# Altium schematic symbol library jlcpcb_2025_04_capacitors_extended_0805.schlib: 3281 symbols (part 3 of 18)
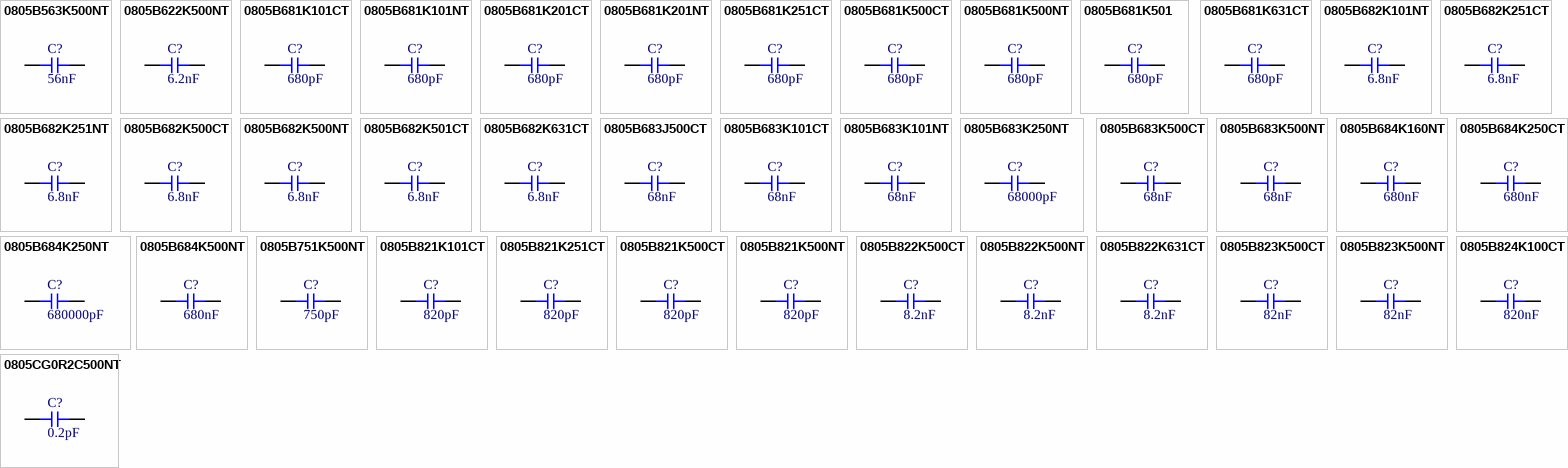
[diagram p84: symbols 0805B563K500NT to 0805CG0R2C500NT]

## 0805CG0R2C500NT
designator C?  Capacitance: 0.2pF  (hidden comment: *)
Capacitor, Ceramic (MLCC), 0.2pF, 50V, SMD 0805; Manufacturer: FH(Guangdong Fenghua Advanced Tech); Manufacturer Part Number: 0805CG0R2C500NT; Package Size: 0805; JLCPCB Basic Part: No; JLCPCB Part Number: C1322376; Supplier 1: LCSC; Category: Capacitors - MLCC; Supplier Part Number 1: C1322376; Voltage Rating: 50V; RoHS: Yes; ComponentLink1Description: Datasheet; ComponentLink1URL: https://wmsc.lcsc.com/wmsc/upload/file/pdf/v2/lcsc/2304140030_FH--Guangdong-Fenghua-Advanced-Tech-0805CG0R2C500NT_C1322376.pdf; ComponentLink2Description: JLCPCB Part URL; ComponentLink2URL: https://jlcpcb.com/partdetail/C1322376; ComponentLink3Description: LCSC Part URL; ComponentLink3URL: https://lcsc.com/product-detail/Multilayer-Ceramic-Capacitors-MLCC---SMD-SMT_FH-Guangdong-Fenghua-Advanced-Tech-FH-Guangdong-Fenghua-Advanced-Tech-0805CG0R2C500NT_C1322376.html
footprint CAP-0805 (0805 (2012M) Capacitor)
pins: 1, 2

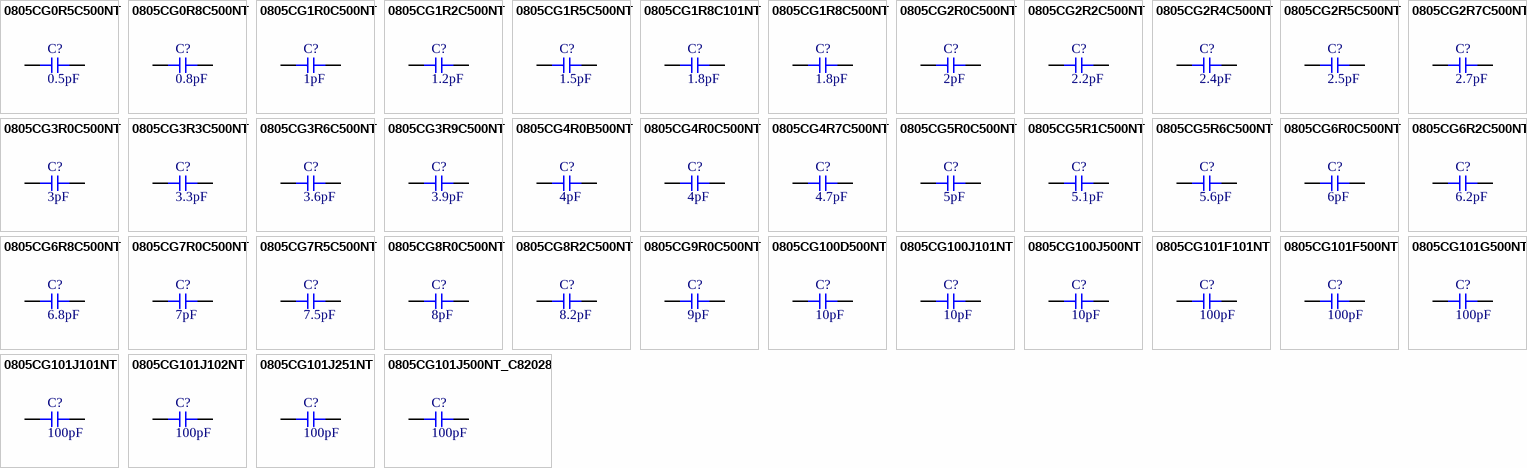
[diagram p9: symbols 0805CG0R5C500NT to 0805CG101J500NT_C82028]

## 0805CG0R5C500NT
designator C?  Capacitance: 0.5pF  (hidden comment: *)
Capacitor, Ceramic (MLCC), 0.5pF, 50V, C0G, SMD 0805; Manufacturer: FH(Guangdong Fenghua Advanced Tech); Manufacturer Part Number: 0805CG0R5C500NT; Package Size: 0805; JLCPCB Basic Part: No; JLCPCB Part Number: C1784; Supplier 1: LCSC; Category: Capacitors - MLCC; Supplier Part Number 1: C1784; Voltage Rating: 50V; Temperature Coefficient: C0G; RoHS: Yes; ComponentLink1Description: Datasheet; ComponentLink1URL: https://wmsc.lcsc.com/wmsc/upload/file/pdf/v2/lcsc/2304140030_FH--Guangdong-Fenghua-Advanced-Tech-0805CG0R5C500NT_C1784.pdf; ComponentLink2Description: JLCPCB Part URL; ComponentLink2URL: https://jlcpcb.com/partdetail/C1784; ComponentLink3Description: LCSC Part URL; ComponentLink3URL: https://lcsc.com/product-detail/Multilayer-Ceramic-Capacitors-MLCC---SMD-SMT_FH-Guangdong-Fenghua-Advanced-Tech-FH-Guangdong-Fenghua-Advanced-Tech-0805CG0R5C500NT_C1784.html
footprint CAP-0805 (0805 (2012M) Capacitor)
pins: 1, 2

## 0805CG0R8C500NT
designator C?  Capacitance: 0.8pF  (hidden comment: *)
Capacitor, Ceramic (MLCC), 0.8pF, 50V, SMD 0805; Manufacturer: FH(Guangdong Fenghua Advanced Tech); Manufacturer Part Number: 0805CG0R8C500NT; Package Size: 0805; JLCPCB Basic Part: No; JLCPCB Part Number: C967583; Supplier 1: LCSC; Category: Capacitors - MLCC; Supplier Part Number 1: C967583; Voltage Rating: 50V; RoHS: Yes; ComponentLink1Description: Datasheet; ComponentLink1URL: https://wmsc.lcsc.com/wmsc/upload/file/pdf/v2/lcsc/2304140030_FH--Guangdong-Fenghua-Advanced-Tech-0805CG0R8C500NT_C967583.pdf; ComponentLink2Description: JLCPCB Part URL; ComponentLink2URL: https://jlcpcb.com/partdetail/C967583; ComponentLink3Description: LCSC Part URL; ComponentLink3URL: https://lcsc.com/product-detail/Multilayer-Ceramic-Capacitors-MLCC---SMD-SMT_FH-Guangdong-Fenghua-Advanced-Tech-FH-Guangdong-Fenghua-Advanced-Tech-0805CG0R8C500NT_C967583.html
footprint CAP-0805 (0805 (2012M) Capacitor)
pins: 1, 2

## 0805CG1R0C500NT
designator C?  Capacitance: 1pF  (hidden comment: *)
Capacitor, Ceramic (MLCC), 1pF, 50V, C0G, SMD 0805; Manufacturer: FH(Guangdong Fenghua Advanced Tech); Manufacturer Part Number: 0805CG1R0C500NT; Package Size: 0805; JLCPCB Basic Part: No; JLCPCB Part Number: C1786; Supplier 1: LCSC; Category: Capacitors - MLCC; Supplier Part Number 1: C1786; Voltage Rating: 50V; Temperature Coefficient: C0G; RoHS: Yes; ComponentLink1Description: Datasheet; ComponentLink1URL: https://wmsc.lcsc.com/wmsc/upload/file/pdf/v2/lcsc/2304140030_FH--Guangdong-Fenghua-Advanced-Tech-0805CG1R0C500NT_C1786.pdf; ComponentLink2Description: JLCPCB Part URL; ComponentLink2URL: https://jlcpcb.com/partdetail/C1786; ComponentLink3Description: LCSC Part URL; ComponentLink3URL: https://lcsc.com/product-detail/Multilayer-Ceramic-Capacitors-MLCC---SMD-SMT_FH-Guangdong-Fenghua-Advanced-Tech-FH-Guangdong-Fenghua-Advanced-Tech-0805CG1R0C500NT_C1786.html
footprint CAP-0805 (0805 (2012M) Capacitor)
pins: 1, 2

## 0805CG1R2C500NT
designator C?  Capacitance: 1.2pF  (hidden comment: *)
Capacitor, Ceramic (MLCC), 1.2pF, 50V, C0G, SMD 0805; Manufacturer: FH(Guangdong Fenghua Advanced Tech); Manufacturer Part Number: 0805CG1R2C500NT; Package Size: 0805; JLCPCB Basic Part: No; JLCPCB Part Number: C1787; Supplier 1: LCSC; Category: Capacitors - MLCC; Supplier Part Number 1: C1787; Voltage Rating: 50V; Temperature Coefficient: C0G; RoHS: Yes; ComponentLink1Description: Datasheet; ComponentLink1URL: https://wmsc.lcsc.com/wmsc/upload/file/pdf/v2/lcsc/2304140030_FH--Guangdong-Fenghua-Advanced-Tech-0805CG1R2C500NT_C1787.pdf; ComponentLink2Description: JLCPCB Part URL; ComponentLink2URL: https://jlcpcb.com/partdetail/C1787; ComponentLink3Description: LCSC Part URL; ComponentLink3URL: https://lcsc.com/product-detail/Multilayer-Ceramic-Capacitors-MLCC---SMD-SMT_FH-Guangdong-Fenghua-Advanced-Tech-FH-Guangdong-Fenghua-Advanced-Tech-0805CG1R2C500NT_C1787.html
footprint CAP-0805 (0805 (2012M) Capacitor)
pins: 1, 2

## 0805CG1R5C500NT
designator C?  Capacitance: 1.5pF  (hidden comment: *)
Capacitor, Ceramic (MLCC), 1.5pF, 50V, C0G, SMD 0805; Manufacturer: FH(Guangdong Fenghua Advanced Tech); Manufacturer Part Number: 0805CG1R5C500NT; Package Size: 0805; JLCPCB Basic Part: No; JLCPCB Part Number: C1788; Supplier 1: LCSC; Category: Capacitors - MLCC; Supplier Part Number 1: C1788; Voltage Rating: 50V; Temperature Coefficient: C0G; RoHS: Yes; ComponentLink1Description: Datasheet; ComponentLink1URL: https://wmsc.lcsc.com/wmsc/upload/file/pdf/v2/lcsc/2304140030_FH--Guangdong-Fenghua-Advanced-Tech-0805CG1R5C500NT_C1788.pdf; ComponentLink2Description: JLCPCB Part URL; ComponentLink2URL: https://jlcpcb.com/partdetail/C1788; ComponentLink3Description: LCSC Part URL; ComponentLink3URL: https://lcsc.com/product-detail/Multilayer-Ceramic-Capacitors-MLCC---SMD-SMT_FH-Guangdong-Fenghua-Advanced-Tech-FH-Guangdong-Fenghua-Advanced-Tech-0805CG1R5C500NT_C1788.html
footprint CAP-0805 (0805 (2012M) Capacitor)
pins: 1, 2

## 0805CG1R8C101NT
designator C?  Capacitance: 1.8pF  (hidden comment: *)
Capacitor, Ceramic (MLCC), 1.8pF, 100V, C0G, SMD 0805; Manufacturer: FH (Guangdong Fenghua Advanced Tech); Manufacturer Part Number: 0805CG1R8C101NT; Package Size: 0805; JLCPCB Basic Part: No; JLCPCB Part Number: C2961290; Supplier 1: LCSC; Category: Capacitors - MLCC; Supplier Part Number 1: C2961290; Voltage Rating: 100V; Temperature Coefficient: C0G; RoHS: Yes; ComponentLink1Description: Datasheet; ComponentLink1URL: https://wmsc.lcsc.com/wmsc/upload/file/pdf/v2/lcsc/2201211500_FH--Guangdong-Fenghua-Advanced-Tech-0805CG1R8C101NT_C2961290.pdf; ComponentLink2Description: JLCPCB Part URL; ComponentLink2URL: https://jlcpcb.com/partdetail/C2961290; ComponentLink3Description: LCSC Part URL; ComponentLink3URL: https://lcsc.com/product-detail/Multilayer-Ceramic-Capacitors-MLCC---SMD-SMT_FH-Guangdong-Fenghua-Advanced-Tech-FH-Guangdong-Fenghua-Advanced-Tech-0805CG1R8C101NT_C2961290.html
footprint CAP-0805 (0805 (2012M) Capacitor)
pins: 1, 2

## 0805CG1R8C500NT
designator C?  Capacitance: 1.8pF  (hidden comment: *)
Capacitor, Ceramic (MLCC), 1.8pF, 50V, C0G, SMD 0805; Manufacturer: FH(Guangdong Fenghua Advanced Tech); Manufacturer Part Number: 0805CG1R8C500NT; Package Size: 0805; JLCPCB Basic Part: No; JLCPCB Part Number: C1789; Supplier 1: LCSC; Category: Capacitors - MLCC; Supplier Part Number 1: C1789; Voltage Rating: 50V; Temperature Coefficient: C0G; RoHS: Yes; ComponentLink1Description: Datasheet; ComponentLink1URL: https://wmsc.lcsc.com/wmsc/upload/file/pdf/v2/lcsc/2304140030_FH--Guangdong-Fenghua-Advanced-Tech-0805CG1R8C500NT_C1789.pdf; ComponentLink2Description: JLCPCB Part URL; ComponentLink2URL: https://jlcpcb.com/partdetail/C1789; ComponentLink3Description: LCSC Part URL; ComponentLink3URL: https://lcsc.com/product-detail/Multilayer-Ceramic-Capacitors-MLCC---SMD-SMT_FH-Guangdong-Fenghua-Advanced-Tech-FH-Guangdong-Fenghua-Advanced-Tech-0805CG1R8C500NT_C1789.html
footprint CAP-0805 (0805 (2012M) Capacitor)
pins: 1, 2

## 0805CG2R0C500NT
designator C?  Capacitance: 2pF  (hidden comment: *)
Capacitor, Ceramic (MLCC), 2pF, 50V, C0G, SMD 0805; Manufacturer: FH(Guangdong Fenghua Advanced Tech); Manufacturer Part Number: 0805CG2R0C500NT; Package Size: 0805; JLCPCB Basic Part: No; JLCPCB Part Number: C1800; Supplier 1: LCSC; Category: Capacitors - MLCC; Supplier Part Number 1: C1800; Voltage Rating: 50V; Temperature Coefficient: C0G; RoHS: Yes; ComponentLink1Description: Datasheet; ComponentLink1URL: https://wmsc.lcsc.com/wmsc/upload/file/pdf/v2/lcsc/2304140030_FH--Guangdong-Fenghua-Advanced-Tech-0805CG2R0C500NT_C1800.pdf; ComponentLink2Description: JLCPCB Part URL; ComponentLink2URL: https://jlcpcb.com/partdetail/C1800; ComponentLink3Description: LCSC Part URL; ComponentLink3URL: https://lcsc.com/product-detail/Multilayer-Ceramic-Capacitors-MLCC---SMD-SMT_FH-Guangdong-Fenghua-Advanced-Tech-FH-Guangdong-Fenghua-Advanced-Tech-0805CG2R0C500NT_C1800.html
footprint CAP-0805 (0805 (2012M) Capacitor)
pins: 1, 2

## 0805CG2R2C500NT
designator C?  Capacitance: 2.2pF  (hidden comment: *)
Capacitor, Ceramic (MLCC), 2.2pF, 50V, C0G, SMD 0805; Manufacturer: FH(Guangdong Fenghua Advanced Tech); Manufacturer Part Number: 0805CG2R2C500NT; Package Size: 0805; JLCPCB Basic Part: No; JLCPCB Part Number: C1801; Supplier 1: LCSC; Category: Capacitors - MLCC; Supplier Part Number 1: C1801; Voltage Rating: 50V; Temperature Coefficient: C0G; RoHS: Yes; ComponentLink1Description: Datasheet; ComponentLink1URL: https://wmsc.lcsc.com/wmsc/upload/file/pdf/v2/lcsc/2304140030_FH--Guangdong-Fenghua-Advanced-Tech-0805CG2R2C500NT_C1801.pdf; ComponentLink2Description: JLCPCB Part URL; ComponentLink2URL: https://jlcpcb.com/partdetail/C1801; ComponentLink3Description: LCSC Part URL; ComponentLink3URL: https://lcsc.com/product-detail/Multilayer-Ceramic-Capacitors-MLCC---SMD-SMT_FH-Guangdong-Fenghua-Advanced-Tech-FH-Guangdong-Fenghua-Advanced-Tech-0805CG2R2C500NT_C1801.html
footprint CAP-0805 (0805 (2012M) Capacitor)
pins: 1, 2

## 0805CG2R4C500NT
designator C?  Capacitance: 2.4pF  (hidden comment: *)
Capacitor, Ceramic (MLCC), 2.4pF, 50V, C0G, SMD 0805; Manufacturer: FH(Guangdong Fenghua Advanced Tech); Manufacturer Part Number: 0805CG2R4C500NT; Package Size: 0805; JLCPCB Basic Part: No; JLCPCB Part Number: C502146; Supplier 1: LCSC; Category: Capacitors - MLCC; Supplier Part Number 1: C502146; Voltage Rating: 50V; Temperature Coefficient: C0G; RoHS: Yes; ComponentLink1Description: Datasheet; ComponentLink1URL: https://wmsc.lcsc.com/wmsc/upload/file/pdf/v2/lcsc/2304140030_FH--Guangdong-Fenghua-Advanced-Tech-0805CG2R4C500NT_C502146.pdf; ComponentLink2Description: JLCPCB Part URL; ComponentLink2URL: https://jlcpcb.com/partdetail/C502146; ComponentLink3Description: LCSC Part URL; ComponentLink3URL: https://lcsc.com/product-detail/Multilayer-Ceramic-Capacitors-MLCC---SMD-SMT_FH-Guangdong-Fenghua-Advanced-Tech-FH-Guangdong-Fenghua-Advanced-Tech-0805CG2R4C500NT_C502146.html
footprint CAP-0805 (0805 (2012M) Capacitor)
pins: 1, 2

## 0805CG2R5C500NT
designator C?  Capacitance: 2.5pF  (hidden comment: *)
Capacitor, Ceramic (MLCC), 2.5pF, 50V, C0G, SMD 0805; Manufacturer: FH(Guangdong Fenghua Advanced Tech); Manufacturer Part Number: 0805CG2R5C500NT; Package Size: 0805; JLCPCB Basic Part: No; JLCPCB Part Number: C1802; Supplier 1: LCSC; Category: Capacitors - MLCC; Supplier Part Number 1: C1802; Voltage Rating: 50V; Temperature Coefficient: C0G; RoHS: Yes; ComponentLink1Description: Datasheet; ComponentLink1URL: https://wmsc.lcsc.com/wmsc/upload/file/pdf/v2/lcsc/2304140030_FH--Guangdong-Fenghua-Advanced-Tech-0805CG2R5C500NT_C1802.pdf; ComponentLink2Description: JLCPCB Part URL; ComponentLink2URL: https://jlcpcb.com/partdetail/C1802; ComponentLink3Description: LCSC Part URL; ComponentLink3URL: https://lcsc.com/product-detail/Multilayer-Ceramic-Capacitors-MLCC---SMD-SMT_FH-Guangdong-Fenghua-Advanced-Tech-FH-Guangdong-Fenghua-Advanced-Tech-0805CG2R5C500NT_C1802.html
footprint CAP-0805 (0805 (2012M) Capacitor)
pins: 1, 2

## 0805CG2R7C500NT
designator C?  Capacitance: 2.7pF  (hidden comment: *)
Capacitor, Ceramic (MLCC), 2.7pF, 50V, C0G, SMD 0805; Manufacturer: FH(Guangdong Fenghua Advanced Tech); Manufacturer Part Number: 0805CG2R7C500NT; Package Size: 0805; JLCPCB Basic Part: No; JLCPCB Part Number: C1803; Supplier 1: LCSC; Category: Capacitors - MLCC; Supplier Part Number 1: C1803; Voltage Rating: 50V; Temperature Coefficient: C0G; RoHS: Yes; ComponentLink1Description: Datasheet; ComponentLink1URL: https://wmsc.lcsc.com/wmsc/upload/file/pdf/v2/lcsc/2304140030_FH--Guangdong-Fenghua-Advanced-Tech-0805CG2R7C500NT_C1803.pdf; ComponentLink2Description: JLCPCB Part URL; ComponentLink2URL: https://jlcpcb.com/partdetail/C1803; ComponentLink3Description: LCSC Part URL; ComponentLink3URL: https://lcsc.com/product-detail/Multilayer-Ceramic-Capacitors-MLCC---SMD-SMT_FH-Guangdong-Fenghua-Advanced-Tech-FH-Guangdong-Fenghua-Advanced-Tech-0805CG2R7C500NT_C1803.html
footprint CAP-0805 (0805 (2012M) Capacitor)
pins: 1, 2

## 0805CG3R0C500NT
designator C?  Capacitance: 3pF  (hidden comment: *)
Capacitor, Ceramic (MLCC), 3pF, 50V, C0G, SMD 0805; Manufacturer: FH(Guangdong Fenghua Advanced Tech); Manufacturer Part Number: 0805CG3R0C500NT; Package Size: 0805; JLCPCB Basic Part: No; JLCPCB Part Number: C1810; Supplier 1: LCSC; Category: Capacitors - MLCC; Supplier Part Number 1: C1810; Voltage Rating: 50V; Temperature Coefficient: C0G; RoHS: Yes; ComponentLink1Description: Datasheet; ComponentLink1URL: https://wmsc.lcsc.com/wmsc/upload/file/pdf/v2/lcsc/2304140030_FH--Guangdong-Fenghua-Advanced-Tech-0805CG3R0C500NT_C1810.pdf; ComponentLink2Description: JLCPCB Part URL; ComponentLink2URL: https://jlcpcb.com/partdetail/C1810; ComponentLink3Description: LCSC Part URL; ComponentLink3URL: https://lcsc.com/product-detail/Multilayer-Ceramic-Capacitors-MLCC---SMD-SMT_FH-Guangdong-Fenghua-Advanced-Tech-FH-Guangdong-Fenghua-Advanced-Tech-0805CG3R0C500NT_C1810.html
footprint CAP-0805 (0805 (2012M) Capacitor)
pins: 1, 2

## 0805CG3R3C500NT
designator C?  Capacitance: 3.3pF  (hidden comment: *)
Capacitor, Ceramic (MLCC), 3.3pF, 50V, C0G, SMD 0805; Manufacturer: FH(Guangdong Fenghua Advanced Tech); Manufacturer Part Number: 0805CG3R3C500NT; Package Size: 0805; JLCPCB Basic Part: No; JLCPCB Part Number: C1811; Supplier 1: LCSC; Category: Capacitors - MLCC; Supplier Part Number 1: C1811; Voltage Rating: 50V; Temperature Coefficient: C0G; RoHS: Yes; ComponentLink1Description: Datasheet; ComponentLink1URL: https://wmsc.lcsc.com/wmsc/upload/file/pdf/v2/lcsc/2304140030_FH--Guangdong-Fenghua-Advanced-Tech-0805CG3R3C500NT_C1811.pdf; ComponentLink2Description: JLCPCB Part URL; ComponentLink2URL: https://jlcpcb.com/partdetail/C1811; ComponentLink3Description: LCSC Part URL; ComponentLink3URL: https://lcsc.com/product-detail/Multilayer-Ceramic-Capacitors-MLCC---SMD-SMT_FH-Guangdong-Fenghua-Advanced-Tech-FH-Guangdong-Fenghua-Advanced-Tech-0805CG3R3C500NT_C1811.html
footprint CAP-0805 (0805 (2012M) Capacitor)
pins: 1, 2

## 0805CG3R6C500NT
designator C?  Capacitance: 3.6pF  (hidden comment: *)
Capacitor, Ceramic (MLCC), 3.6pF, 50V, C0G, SMD 0805; Manufacturer: FH(Guangdong Fenghua Advanced Tech); Manufacturer Part Number: 0805CG3R6C500NT; Package Size: 0805; JLCPCB Basic Part: No; JLCPCB Part Number: C1812; Supplier 1: LCSC; Category: Capacitors - MLCC; Supplier Part Number 1: C1812; Voltage Rating: 50V; Temperature Coefficient: C0G; RoHS: Yes; ComponentLink1Description: Datasheet; ComponentLink1URL: https://wmsc.lcsc.com/wmsc/upload/file/pdf/v2/lcsc/2304140030_FH--Guangdong-Fenghua-Advanced-Tech-0805CG3R6C500NT_C1812.pdf; ComponentLink2Description: JLCPCB Part URL; ComponentLink2URL: https://jlcpcb.com/partdetail/C1812; ComponentLink3Description: LCSC Part URL; ComponentLink3URL: https://lcsc.com/product-detail/Multilayer-Ceramic-Capacitors-MLCC---SMD-SMT_FH-Guangdong-Fenghua-Advanced-Tech-FH-Guangdong-Fenghua-Advanced-Tech-0805CG3R6C500NT_C1812.html
footprint CAP-0805 (0805 (2012M) Capacitor)
pins: 1, 2

## 0805CG3R9C500NT
designator C?  Capacitance: 3.9pF  (hidden comment: *)
Capacitor, Ceramic (MLCC), 3.9pF, 50V, C0G, SMD 0805; Manufacturer: FH(Guangdong Fenghua Advanced Tech); Manufacturer Part Number: 0805CG3R9C500NT; Package Size: 0805; JLCPCB Basic Part: No; JLCPCB Part Number: C1813; Supplier 1: LCSC; Category: Capacitors - MLCC; Supplier Part Number 1: C1813; Voltage Rating: 50V; Temperature Coefficient: C0G; RoHS: Yes; ComponentLink1Description: Datasheet; ComponentLink1URL: https://wmsc.lcsc.com/wmsc/upload/file/pdf/v2/lcsc/2304140030_FH--Guangdong-Fenghua-Advanced-Tech-0805CG3R9C500NT_C1813.pdf; ComponentLink2Description: JLCPCB Part URL; ComponentLink2URL: https://jlcpcb.com/partdetail/C1813; ComponentLink3Description: LCSC Part URL; ComponentLink3URL: https://lcsc.com/product-detail/Multilayer-Ceramic-Capacitors-MLCC---SMD-SMT_FH-Guangdong-Fenghua-Advanced-Tech-FH-Guangdong-Fenghua-Advanced-Tech-0805CG3R9C500NT_C1813.html
footprint CAP-0805 (0805 (2012M) Capacitor)
pins: 1, 2

## 0805CG4R0B500NT
designator C?  Capacitance: 4pF  (hidden comment: *)
Capacitor, Ceramic (MLCC), 4pF, 50V, C0G, SMD 0805; Manufacturer: FH(Guangdong Fenghua Advanced Tech); Manufacturer Part Number: 0805CG4R0B500NT; Package Size: 0805; JLCPCB Basic Part: No; JLCPCB Part Number: C574059; Supplier 1: LCSC; Category: Capacitors - MLCC; Supplier Part Number 1: C574059; Voltage Rating: 50V; Temperature Coefficient: C0G; RoHS: Yes; ComponentLink1Description: Datasheet; ComponentLink1URL: https://wmsc.lcsc.com/wmsc/upload/file/pdf/v2/lcsc/2006011905_FH--Guangdong-Fenghua-Advanced-Tech-0805CG4R0B500NT_C574059.pdf; ComponentLink2Description: JLCPCB Part URL; ComponentLink2URL: https://jlcpcb.com/partdetail/C574059; ComponentLink3Description: LCSC Part URL; ComponentLink3URL: https://lcsc.com/product-detail/Multilayer-Ceramic-Capacitors-MLCC---SMD-SMT_FH-Guangdong-Fenghua-Advanced-Tech-FH-Guangdong-Fenghua-Advanced-Tech-0805CG4R0B500NT_C574059.html
footprint CAP-0805 (0805 (2012M) Capacitor)
pins: 1, 2

## 0805CG4R0C500NT
designator C?  Capacitance: 4pF  (hidden comment: *)
Capacitor, Ceramic (MLCC), 4pF, 50V, C0G, SMD 0805; Manufacturer: FH(Guangdong Fenghua Advanced Tech); Manufacturer Part Number: 0805CG4R0C500NT; Package Size: 0805; JLCPCB Basic Part: No; JLCPCB Part Number: C1819; Supplier 1: LCSC; Category: Capacitors - MLCC; Supplier Part Number 1: C1819; Voltage Rating: 50V; Temperature Coefficient: C0G; RoHS: Yes; ComponentLink1Description: Datasheet; ComponentLink1URL: https://wmsc.lcsc.com/wmsc/upload/file/pdf/v2/lcsc/2304140030_FH--Guangdong-Fenghua-Advanced-Tech-0805CG4R0C500NT_C1819.pdf; ComponentLink2Description: JLCPCB Part URL; ComponentLink2URL: https://jlcpcb.com/partdetail/C1819; ComponentLink3Description: LCSC Part URL; ComponentLink3URL: https://lcsc.com/product-detail/Multilayer-Ceramic-Capacitors-MLCC---SMD-SMT_FH-Guangdong-Fenghua-Advanced-Tech-FH-Guangdong-Fenghua-Advanced-Tech-0805CG4R0C500NT_C1819.html
footprint CAP-0805 (0805 (2012M) Capacitor)
pins: 1, 2

## 0805CG4R7C500NT
designator C?  Capacitance: 4.7pF  (hidden comment: *)
Capacitor, Ceramic (MLCC), 4.7pF, 50V, C0G, SMD 0805; Manufacturer: FH(Guangdong Fenghua Advanced Tech); Manufacturer Part Number: 0805CG4R7C500NT; Package Size: 0805; JLCPCB Basic Part: No; JLCPCB Part Number: C1820; Supplier 1: LCSC; Category: Capacitors - MLCC; Supplier Part Number 1: C1820; Voltage Rating: 50V; Temperature Coefficient: C0G; RoHS: Yes; ComponentLink1Description: Datasheet; ComponentLink1URL: https://wmsc.lcsc.com/wmsc/upload/file/pdf/v2/lcsc/2304140030_FH--Guangdong-Fenghua-Advanced-Tech-0805CG4R7C500NT_C1820.pdf; ComponentLink2Description: JLCPCB Part URL; ComponentLink2URL: https://jlcpcb.com/partdetail/C1820; ComponentLink3Description: LCSC Part URL; ComponentLink3URL: https://lcsc.com/product-detail/Multilayer-Ceramic-Capacitors-MLCC---SMD-SMT_FH-Guangdong-Fenghua-Advanced-Tech-FH-Guangdong-Fenghua-Advanced-Tech-0805CG4R7C500NT_C1820.html
footprint CAP-0805 (0805 (2012M) Capacitor)
pins: 1, 2

## 0805CG5R0C500NT
designator C?  Capacitance: 5pF  (hidden comment: *)
Capacitor, Ceramic (MLCC), 5pF, 50V, C0G, SMD 0805; Manufacturer: FH(Guangdong Fenghua Advanced Tech); Manufacturer Part Number: 0805CG5R0C500NT; Package Size: 0805; JLCPCB Basic Part: No; JLCPCB Part Number: C1824; Supplier 1: LCSC; Category: Capacitors - MLCC; Supplier Part Number 1: C1824; Voltage Rating: 50V; Temperature Coefficient: C0G; RoHS: Yes; ComponentLink1Description: Datasheet; ComponentLink1URL: https://wmsc.lcsc.com/wmsc/upload/file/pdf/v2/lcsc/2304140030_FH--Guangdong-Fenghua-Advanced-Tech-0805CG5R0C500NT_C1824.pdf; ComponentLink2Description: JLCPCB Part URL; ComponentLink2URL: https://jlcpcb.com/partdetail/C1824; ComponentLink3Description: LCSC Part URL; ComponentLink3URL: https://lcsc.com/product-detail/Multilayer-Ceramic-Capacitors-MLCC---SMD-SMT_FH-Guangdong-Fenghua-Advanced-Tech-FH-Guangdong-Fenghua-Advanced-Tech-0805CG5R0C500NT_C1824.html
footprint CAP-0805 (0805 (2012M) Capacitor)
pins: 1, 2

## 0805CG5R1C500NT
designator C?  Capacitance: 5.1pF  (hidden comment: *)
Capacitor, Ceramic (MLCC), 5.1pF, 50V, C0G, SMD 0805; Manufacturer: FH(Guangdong Fenghua Advanced Tech); Manufacturer Part Number: 0805CG5R1C500NT; Package Size: 0805; JLCPCB Basic Part: No; JLCPCB Part Number: C1825; Supplier 1: LCSC; Category: Capacitors - MLCC; Supplier Part Number 1: C1825; Voltage Rating: 50V; Temperature Coefficient: C0G; RoHS: Yes; ComponentLink1Description: Datasheet; ComponentLink1URL: https://wmsc.lcsc.com/wmsc/upload/file/pdf/v2/lcsc/2304140030_FH--Guangdong-Fenghua-Advanced-Tech-0805CG5R1C500NT_C1825.pdf; ComponentLink2Description: JLCPCB Part URL; ComponentLink2URL: https://jlcpcb.com/partdetail/C1825; ComponentLink3Description: LCSC Part URL; ComponentLink3URL: https://lcsc.com/product-detail/Multilayer-Ceramic-Capacitors-MLCC---SMD-SMT_FH-Guangdong-Fenghua-Advanced-Tech-FH-Guangdong-Fenghua-Advanced-Tech-0805CG5R1C500NT_C1825.html
footprint CAP-0805 (0805 (2012M) Capacitor)
pins: 1, 2

## 0805CG5R6C500NT
designator C?  Capacitance: 5.6pF  (hidden comment: *)
Capacitor, Ceramic (MLCC), 5.6pF, 50V, C0G, SMD 0805; Manufacturer: FH(Guangdong Fenghua Advanced Tech); Manufacturer Part Number: 0805CG5R6C500NT; Package Size: 0805; JLCPCB Basic Part: No; JLCPCB Part Number: C1826; Supplier 1: LCSC; Category: Capacitors - MLCC; Supplier Part Number 1: C1826; Voltage Rating: 50V; Temperature Coefficient: C0G; RoHS: Yes; ComponentLink1Description: Datasheet; ComponentLink1URL: https://wmsc.lcsc.com/wmsc/upload/file/pdf/v2/lcsc/2304140030_FH--Guangdong-Fenghua-Advanced-Tech-0805CG5R6C500NT_C1826.pdf; ComponentLink2Description: JLCPCB Part URL; ComponentLink2URL: https://jlcpcb.com/partdetail/C1826; ComponentLink3Description: LCSC Part URL; ComponentLink3URL: https://lcsc.com/product-detail/Multilayer-Ceramic-Capacitors-MLCC---SMD-SMT_FH-Guangdong-Fenghua-Advanced-Tech-FH-Guangdong-Fenghua-Advanced-Tech-0805CG5R6C500NT_C1826.html
footprint CAP-0805 (0805 (2012M) Capacitor)
pins: 1, 2

## 0805CG6R0C500NT
designator C?  Capacitance: 6pF  (hidden comment: *)
Capacitor, Ceramic (MLCC), 6pF, 50V, C0G, SMD 0805; Manufacturer: FH(Guangdong Fenghua Advanced Tech); Manufacturer Part Number: 0805CG6R0C500NT; Package Size: 0805; JLCPCB Basic Part: No; JLCPCB Part Number: C67560; Supplier 1: LCSC; Category: Capacitors - MLCC; Supplier Part Number 1: C67560; Voltage Rating: 50V; Temperature Coefficient: C0G; RoHS: Yes; ComponentLink1Description: Datasheet; ComponentLink1URL: https://wmsc.lcsc.com/wmsc/upload/file/pdf/v2/lcsc/2304140030_FH--Guangdong-Fenghua-Advanced-Tech-0805CG6R0C500NT_C67560.pdf; ComponentLink2Description: JLCPCB Part URL; ComponentLink2URL: https://jlcpcb.com/partdetail/C67560; ComponentLink3Description: LCSC Part URL; ComponentLink3URL: https://lcsc.com/product-detail/Multilayer-Ceramic-Capacitors-MLCC---SMD-SMT_FH-Guangdong-Fenghua-Advanced-Tech-FH-Guangdong-Fenghua-Advanced-Tech-0805CG6R0C500NT_C67560.html
footprint CAP-0805 (0805 (2012M) Capacitor)
pins: 1, 2

## 0805CG6R2C500NT
designator C?  Capacitance: 6.2pF  (hidden comment: *)
Capacitor, Ceramic (MLCC), 6.2pF, 50V, C0G, SMD 0805; Manufacturer: FH(Guangdong Fenghua Advanced Tech); Manufacturer Part Number: 0805CG6R2C500NT; Package Size: 0805; JLCPCB Basic Part: No; JLCPCB Part Number: C1831; Supplier 1: LCSC; Category: Capacitors - MLCC; Supplier Part Number 1: C1831; Voltage Rating: 50V; Temperature Coefficient: C0G; RoHS: Yes; ComponentLink1Description: Datasheet; ComponentLink1URL: https://wmsc.lcsc.com/wmsc/upload/file/pdf/v2/lcsc/2304140030_FH--Guangdong-Fenghua-Advanced-Tech-0805CG6R2C500NT_C1831.pdf; ComponentLink2Description: JLCPCB Part URL; ComponentLink2URL: https://jlcpcb.com/partdetail/C1831; ComponentLink3Description: LCSC Part URL; ComponentLink3URL: https://lcsc.com/product-detail/Multilayer-Ceramic-Capacitors-MLCC---SMD-SMT_FH-Guangdong-Fenghua-Advanced-Tech-FH-Guangdong-Fenghua-Advanced-Tech-0805CG6R2C500NT_C1831.html
footprint CAP-0805 (0805 (2012M) Capacitor)
pins: 1, 2

## 0805CG6R8C500NT
designator C?  Capacitance: 6.8pF  (hidden comment: *)
Capacitor, Ceramic (MLCC), 6.8pF, 50V, C0G, SMD 0805; Manufacturer: FH(Guangdong Fenghua Advanced Tech); Manufacturer Part Number: 0805CG6R8C500NT; Package Size: 0805; JLCPCB Basic Part: No; JLCPCB Part Number: C1832; Supplier 1: LCSC; Category: Capacitors - MLCC; Supplier Part Number 1: C1832; Voltage Rating: 50V; Temperature Coefficient: C0G; RoHS: Yes; ComponentLink1Description: Datasheet; ComponentLink1URL: https://wmsc.lcsc.com/wmsc/upload/file/pdf/v2/lcsc/2304140030_FH--Guangdong-Fenghua-Advanced-Tech-0805CG6R8C500NT_C1832.pdf; ComponentLink2Description: JLCPCB Part URL; ComponentLink2URL: https://jlcpcb.com/partdetail/C1832; ComponentLink3Description: LCSC Part URL; ComponentLink3URL: https://lcsc.com/product-detail/Multilayer-Ceramic-Capacitors-MLCC---SMD-SMT_FH-Guangdong-Fenghua-Advanced-Tech-FH-Guangdong-Fenghua-Advanced-Tech-0805CG6R8C500NT_C1832.html
footprint CAP-0805 (0805 (2012M) Capacitor)
pins: 1, 2

## 0805CG7R0C500NT
designator C?  Capacitance: 7pF  (hidden comment: *)
Capacitor, Ceramic (MLCC), 7pF, 50V, C0G, SMD 0805; Manufacturer: FH(Guangdong Fenghua Advanced Tech); Manufacturer Part Number: 0805CG7R0C500NT; Package Size: 0805; JLCPCB Basic Part: No; JLCPCB Part Number: C1836; Supplier 1: LCSC; Category: Capacitors - MLCC; Supplier Part Number 1: C1836; Voltage Rating: 50V; Temperature Coefficient: C0G; RoHS: Yes; ComponentLink1Description: Datasheet; ComponentLink1URL: https://wmsc.lcsc.com/wmsc/upload/file/pdf/v2/lcsc/2304140030_FH--Guangdong-Fenghua-Advanced-Tech-0805CG7R0C500NT_C1836.pdf; ComponentLink2Description: JLCPCB Part URL; ComponentLink2URL: https://jlcpcb.com/partdetail/C1836; ComponentLink3Description: LCSC Part URL; ComponentLink3URL: https://lcsc.com/product-detail/Multilayer-Ceramic-Capacitors-MLCC---SMD-SMT_FH-Guangdong-Fenghua-Advanced-Tech-FH-Guangdong-Fenghua-Advanced-Tech-0805CG7R0C500NT_C1836.html
footprint CAP-0805 (0805 (2012M) Capacitor)
pins: 1, 2

## 0805CG7R5C500NT
designator C?  Capacitance: 7.5pF  (hidden comment: *)
Capacitor, Ceramic (MLCC), 7.5pF, 50V, C0G, SMD 0805; Manufacturer: FH(Guangdong Fenghua Advanced Tech); Manufacturer Part Number: 0805CG7R5C500NT; Package Size: 0805; JLCPCB Basic Part: No; JLCPCB Part Number: C1837; Supplier 1: LCSC; Category: Capacitors - MLCC; Supplier Part Number 1: C1837; Voltage Rating: 50V; Temperature Coefficient: C0G; RoHS: Yes; ComponentLink1Description: Datasheet; ComponentLink1URL: https://wmsc.lcsc.com/wmsc/upload/file/pdf/v2/lcsc/2304140030_FH--Guangdong-Fenghua-Advanced-Tech-0805CG7R5C500NT_C1837.pdf; ComponentLink2Description: JLCPCB Part URL; ComponentLink2URL: https://jlcpcb.com/partdetail/C1837; ComponentLink3Description: LCSC Part URL; ComponentLink3URL: https://lcsc.com/product-detail/Multilayer-Ceramic-Capacitors-MLCC---SMD-SMT_FH-Guangdong-Fenghua-Advanced-Tech-FH-Guangdong-Fenghua-Advanced-Tech-0805CG7R5C500NT_C1837.html
footprint CAP-0805 (0805 (2012M) Capacitor)
pins: 1, 2

## 0805CG8R0C500NT
designator C?  Capacitance: 8pF  (hidden comment: *)
Capacitor, Ceramic (MLCC), 8pF, 50V, C0G, SMD 0805; Manufacturer: FH(Guangdong Fenghua Advanced Tech); Manufacturer Part Number: 0805CG8R0C500NT; Package Size: 0805; JLCPCB Basic Part: No; JLCPCB Part Number: C1839; Supplier 1: LCSC; Category: Capacitors - MLCC; Supplier Part Number 1: C1839; Voltage Rating: 50V; Temperature Coefficient: C0G; RoHS: Yes; ComponentLink1Description: Datasheet; ComponentLink1URL: https://wmsc.lcsc.com/wmsc/upload/file/pdf/v2/lcsc/2304140030_FH--Guangdong-Fenghua-Advanced-Tech-0805CG8R0C500NT_C1839.pdf; ComponentLink2Description: JLCPCB Part URL; ComponentLink2URL: https://jlcpcb.com/partdetail/C1839; ComponentLink3Description: LCSC Part URL; ComponentLink3URL: https://lcsc.com/product-detail/Multilayer-Ceramic-Capacitors-MLCC---SMD-SMT_FH-Guangdong-Fenghua-Advanced-Tech-FH-Guangdong-Fenghua-Advanced-Tech-0805CG8R0C500NT_C1839.html
footprint CAP-0805 (0805 (2012M) Capacitor)
pins: 1, 2

## 0805CG8R2C500NT
designator C?  Capacitance: 8.2pF  (hidden comment: *)
Capacitor, Ceramic (MLCC), 8.2pF, 50V, C0G, SMD 0805; Manufacturer: FH(Guangdong Fenghua Advanced Tech); Manufacturer Part Number: 0805CG8R2C500NT; Package Size: 0805; JLCPCB Basic Part: No; JLCPCB Part Number: C1840; Supplier 1: LCSC; Category: Capacitors - MLCC; Supplier Part Number 1: C1840; Voltage Rating: 50V; Temperature Coefficient: C0G; RoHS: Yes; ComponentLink1Description: Datasheet; ComponentLink1URL: https://wmsc.lcsc.com/wmsc/upload/file/pdf/v2/lcsc/2304140030_FH--Guangdong-Fenghua-Advanced-Tech-0805CG8R2C500NT_C1840.pdf; ComponentLink2Description: JLCPCB Part URL; ComponentLink2URL: https://jlcpcb.com/partdetail/C1840; ComponentLink3Description: LCSC Part URL; ComponentLink3URL: https://lcsc.com/product-detail/Multilayer-Ceramic-Capacitors-MLCC---SMD-SMT_FH-Guangdong-Fenghua-Advanced-Tech-FH-Guangdong-Fenghua-Advanced-Tech-0805CG8R2C500NT_C1840.html
footprint CAP-0805 (0805 (2012M) Capacitor)
pins: 1, 2

## 0805CG9R0C500NT
designator C?  Capacitance: 9pF  (hidden comment: *)
Capacitor, Ceramic (MLCC), 9pF, 50V, C0G, SMD 0805; Manufacturer: FH(Guangdong Fenghua Advanced Tech); Manufacturer Part Number: 0805CG9R0C500NT; Package Size: 0805; JLCPCB Basic Part: No; JLCPCB Part Number: C1844; Supplier 1: LCSC; Category: Capacitors - MLCC; Supplier Part Number 1: C1844; Voltage Rating: 50V; Temperature Coefficient: C0G; RoHS: Yes; ComponentLink1Description: Datasheet; ComponentLink1URL: https://wmsc.lcsc.com/wmsc/upload/file/pdf/v2/lcsc/2304140030_FH--Guangdong-Fenghua-Advanced-Tech-0805CG9R0C500NT_C1844.pdf; ComponentLink2Description: JLCPCB Part URL; ComponentLink2URL: https://jlcpcb.com/partdetail/C1844; ComponentLink3Description: LCSC Part URL; ComponentLink3URL: https://lcsc.com/product-detail/Multilayer-Ceramic-Capacitors-MLCC---SMD-SMT_FH-Guangdong-Fenghua-Advanced-Tech-FH-Guangdong-Fenghua-Advanced-Tech-0805CG9R0C500NT_C1844.html
footprint CAP-0805 (0805 (2012M) Capacitor)
pins: 1, 2

## 0805CG100D500NT
designator C?  Capacitance: 10pF  (hidden comment: *)
Capacitor, Ceramic (MLCC), 10pF, 50V, C0G, SMD 0805; Manufacturer: FH (Guangdong Fenghua Advanced Tech); Manufacturer Part Number: 0805CG100D500NT; Package Size: 0805; JLCPCB Basic Part: No; JLCPCB Part Number: C313093; Supplier 1: LCSC; Category: Capacitors - MLCC; Supplier Part Number 1: C313093; Voltage Rating: 50V; Temperature Coefficient: C0G; RoHS: Yes; ComponentLink1Description: Datasheet; ComponentLink1URL: https://wmsc.lcsc.com/wmsc/upload/file/pdf/v2/lcsc/2201242230_FH--Guangdong-Fenghua-Advanced-Tech-0805CG100D500NT_C313093.pdf; ComponentLink2Description: JLCPCB Part URL; ComponentLink2URL: https://jlcpcb.com/partdetail/C313093; ComponentLink3Description: LCSC Part URL; ComponentLink3URL: https://lcsc.com/product-detail/Multilayer-Ceramic-Capacitors-MLCC---SMD-SMT_FH-Guangdong-Fenghua-Advanced-Tech-FH-Guangdong-Fenghua-Advanced-Tech-0805CG100D500NT_C313093.html
footprint CAP-0805 (0805 (2012M) Capacitor)
pins: 1, 2

## 0805CG100J101NT
designator C?  Capacitance: 10pF  (hidden comment: *)
Capacitor, Ceramic (MLCC), 10pF, ±5%, 100V, C0G, ±5%, SMD 0805; Manufacturer: FH(Guangdong Fenghua Advanced Tech); Manufacturer Part Number: 0805CG100J101NT; Package Size: 0805; JLCPCB Basic Part: No; JLCPCB Part Number: C179756; Supplier 1: LCSC; Category: Capacitors - MLCC; Supplier Part Number 1: C179756; Tolerance: ±5%; Voltage Rating: 100V; Temperature Coefficient: C0G; RoHS: Yes; ComponentLink1Description: Datasheet; ComponentLink1URL: https://wmsc.lcsc.com/wmsc/upload/file/pdf/v2/lcsc/2304140030_FH--Guangdong-Fenghua-Advanced-Tech-0805CG100J101NT_C179756.pdf; ComponentLink2Description: JLCPCB Part URL; ComponentLink2URL: https://jlcpcb.com/partdetail/C179756; ComponentLink3Description: LCSC Part URL; ComponentLink3URL: https://lcsc.com/product-detail/Multilayer-Ceramic-Capacitors-MLCC---SMD-SMT_FH-Guangdong-Fenghua-Advanced-Tech-FH-Guangdong-Fenghua-Advanced-Tech-0805CG100J101NT_C179756.html
footprint CAP-0805 (0805 (2012M) Capacitor)
pins: 1, 2

## 0805CG100J500NT
designator C?  Capacitance: 10pF  (hidden comment: *)
Capacitor, Ceramic (MLCC), 10pF, ±5%, 50V, C0G, ±5%, SMD 0805; Manufacturer: FH(Guangdong Fenghua Advanced Tech); Manufacturer Part Number: 0805CG100J500NT; Package Size: 0805; JLCPCB Basic Part: No; JLCPCB Part Number: C157608; Supplier 1: LCSC; Category: Capacitors - MLCC; Supplier Part Number 1: C157608; Tolerance: ±5%; Voltage Rating: 50V; Temperature Coefficient: C0G; RoHS: Yes; ComponentLink1Description: Datasheet; ComponentLink1URL: https://wmsc.lcsc.com/wmsc/upload/file/pdf/v2/lcsc/2304140030_FH--Guangdong-Fenghua-Advanced-Tech-0805CG100J500NT_C157608.pdf; ComponentLink2Description: JLCPCB Part URL; ComponentLink2URL: https://jlcpcb.com/partdetail/C157608; ComponentLink3Description: LCSC Part URL; ComponentLink3URL: https://lcsc.com/product-detail/Multilayer-Ceramic-Capacitors-MLCC---SMD-SMT_FH-Guangdong-Fenghua-Advanced-Tech-FH-Guangdong-Fenghua-Advanced-Tech-0805CG100J500NT_C157608.html
footprint CAP-0805 (0805 (2012M) Capacitor)
pins: 1, 2

## 0805CG101F101NT
designator C?  Capacitance: 100pF  (hidden comment: *)
Capacitor, Ceramic (MLCC), 100pF, ±1%, 100V, C0G, ±1%, SMD 0805; Manufacturer: FH(Guangdong Fenghua Advanced Tech); Manufacturer Part Number: 0805CG101F101NT; Package Size: 0805; JLCPCB Basic Part: No; JLCPCB Part Number: C464454; Supplier 1: LCSC; Category: Capacitors - MLCC; Supplier Part Number 1: C464454; Tolerance: ±1%; Voltage Rating: 100V; Temperature Coefficient: C0G; RoHS: Yes; ComponentLink1Description: Datasheet; ComponentLink1URL: https://wmsc.lcsc.com/wmsc/upload/file/pdf/v2/lcsc/2304140030_FH--Guangdong-Fenghua-Advanced-Tech-0805CG101F101NT_C464454.pdf; ComponentLink2Description: JLCPCB Part URL; ComponentLink2URL: https://jlcpcb.com/partdetail/C464454; ComponentLink3Description: LCSC Part URL; ComponentLink3URL: https://lcsc.com/product-detail/Multilayer-Ceramic-Capacitors-MLCC---SMD-SMT_FH-Guangdong-Fenghua-Advanced-Tech-FH-Guangdong-Fenghua-Advanced-Tech-0805CG101F101NT_C464454.html
footprint CAP-0805 (0805 (2012M) Capacitor)
pins: 1, 2

## 0805CG101F500NT
designator C?  Capacitance: 100pF  (hidden comment: *)
Capacitor, Ceramic (MLCC), 100pF, ±1%, 50V, C0G, ±1%, SMD 0805; Manufacturer: FH(Guangdong Fenghua Advanced Tech); Manufacturer Part Number: 0805CG101F500NT; Package Size: 0805; JLCPCB Basic Part: No; JLCPCB Part Number: C182933; Supplier 1: LCSC; Category: Capacitors - MLCC; Supplier Part Number 1: C182933; Tolerance: ±1%; Voltage Rating: 50V; Temperature Coefficient: C0G; RoHS: Yes; ComponentLink1Description: Datasheet; ComponentLink1URL: https://wmsc.lcsc.com/wmsc/upload/file/pdf/v2/lcsc/2304140030_FH--Guangdong-Fenghua-Advanced-Tech-0805CG101F500NT_C182933.pdf; ComponentLink2Description: JLCPCB Part URL; ComponentLink2URL: https://jlcpcb.com/partdetail/C182933; ComponentLink3Description: LCSC Part URL; ComponentLink3URL: https://lcsc.com/product-detail/Multilayer-Ceramic-Capacitors-MLCC---SMD-SMT_FH-Guangdong-Fenghua-Advanced-Tech-FH-Guangdong-Fenghua-Advanced-Tech-0805CG101F500NT_C182933.html
footprint CAP-0805 (0805 (2012M) Capacitor)
pins: 1, 2

## 0805CG101G500NT
designator C?  Capacitance: 100pF  (hidden comment: *)
Capacitor, Ceramic (MLCC), 100pF, ±2%, 50V, C0G, ±2%, SMD 0805; Manufacturer: FH(Guangdong Fenghua Advanced Tech); Manufacturer Part Number: 0805CG101G500NT; Package Size: 0805; JLCPCB Basic Part: No; JLCPCB Part Number: C182934; Supplier 1: LCSC; Category: Capacitors - MLCC; Supplier Part Number 1: C182934; Tolerance: ±2%; Voltage Rating: 50V; Temperature Coefficient: C0G; RoHS: Yes; ComponentLink1Description: Datasheet; ComponentLink1URL: https://wmsc.lcsc.com/wmsc/upload/file/pdf/v2/lcsc/2304140030_FH--Guangdong-Fenghua-Advanced-Tech-0805CG101G500NT_C182934.pdf; ComponentLink2Description: JLCPCB Part URL; ComponentLink2URL: https://jlcpcb.com/partdetail/C182934; ComponentLink3Description: LCSC Part URL; ComponentLink3URL: https://lcsc.com/product-detail/Multilayer-Ceramic-Capacitors-MLCC---SMD-SMT_FH-Guangdong-Fenghua-Advanced-Tech-FH-Guangdong-Fenghua-Advanced-Tech-0805CG101G500NT_C182934.html
footprint CAP-0805 (0805 (2012M) Capacitor)
pins: 1, 2

## 0805CG101J101NT
designator C?  Capacitance: 100pF  (hidden comment: *)
Capacitor, Ceramic (MLCC), 100pF, ±5%, 100V, C0G, ±5%, SMD 0805; Manufacturer: FH(Guangdong Fenghua Advanced Tech); Manufacturer Part Number: 0805CG101J101NT; Package Size: 0805; JLCPCB Basic Part: No; JLCPCB Part Number: C37456; Supplier 1: LCSC; Category: Capacitors - MLCC; Supplier Part Number 1: C37456; Tolerance: ±5%; Voltage Rating: 100V; Temperature Coefficient: C0G; RoHS: Yes; ComponentLink1Description: Datasheet; ComponentLink1URL: https://wmsc.lcsc.com/wmsc/upload/file/pdf/v2/lcsc/2304140030_FH--Guangdong-Fenghua-Advanced-Tech-0805CG101J101NT_C37456.pdf; ComponentLink2Description: JLCPCB Part URL; ComponentLink2URL: https://jlcpcb.com/partdetail/C37456; ComponentLink3Description: LCSC Part URL; ComponentLink3URL: https://lcsc.com/product-detail/Multilayer-Ceramic-Capacitors-MLCC---SMD-SMT_FH-Guangdong-Fenghua-Advanced-Tech-FH-Guangdong-Fenghua-Advanced-Tech-0805CG101J101NT_C37456.html
footprint CAP-0805 (0805 (2012M) Capacitor)
pins: 1, 2

## 0805CG101J102NT
designator C?  Capacitance: 100pF  (hidden comment: *)
Capacitor, Ceramic (MLCC), 100pF, ±5%, 1kV, C0G, ±5%, SMD 0805; Manufacturer: FH (Guangdong Fenghua Advanced Tech); Manufacturer Part Number: 0805CG101J102NT; Package Size: 0805; JLCPCB Basic Part: No; JLCPCB Part Number: C967584; Supplier 1: LCSC; Category: Capacitors - MLCC; Supplier Part Number 1: C967584; Tolerance: ±5%; Voltage Rating: 1kV; Temperature Coefficient: C0G; RoHS: Yes; ComponentLink1Description: Datasheet; ComponentLink1URL: https://wmsc.lcsc.com/wmsc/upload/file/pdf/v2/lcsc/2304140030_FH--Guangdong-Fenghua-Advanced-Tech-0805CG101J102NT_C967584.pdf; ComponentLink2Description: JLCPCB Part URL; ComponentLink2URL: https://jlcpcb.com/partdetail/C967584; ComponentLink3Description: LCSC Part URL; ComponentLink3URL: https://lcsc.com/product-detail/Multilayer-Ceramic-Capacitors-MLCC---SMD-SMT_FH-Guangdong-Fenghua-Advanced-Tech-FH-Guangdong-Fenghua-Advanced-Tech-0805CG101J102NT_C967584.html
footprint CAP-0805 (0805 (2012M) Capacitor)
pins: 1, 2

## 0805CG101J251NT
designator C?  Capacitance: 100pF  (hidden comment: *)
Capacitor, Ceramic (MLCC), 100pF, ±5%, 250V, C0G, ±5%, SMD 0805; Manufacturer: FH(Guangdong Fenghua Advanced Tech); Manufacturer Part Number: 0805CG101J251NT; Package Size: 0805; JLCPCB Basic Part: No; JLCPCB Part Number: C66331; Supplier 1: LCSC; Category: Capacitors - MLCC; Supplier Part Number 1: C66331; Tolerance: ±5%; Voltage Rating: 250V; Temperature Coefficient: C0G; RoHS: Yes; ComponentLink1Description: Datasheet; ComponentLink1URL: https://wmsc.lcsc.com/wmsc/upload/file/pdf/v2/lcsc/2304140030_FH--Guangdong-Fenghua-Advanced-Tech-0805CG101J251NT_C66331.pdf; ComponentLink2Description: JLCPCB Part URL; ComponentLink2URL: https://jlcpcb.com/partdetail/C66331; ComponentLink3Description: LCSC Part URL; ComponentLink3URL: https://lcsc.com/product-detail/Multilayer-Ceramic-Capacitors-MLCC---SMD-SMT_FH-Guangdong-Fenghua-Advanced-Tech-FH-Guangdong-Fenghua-Advanced-Tech-0805CG101J251NT_C66331.html
footprint CAP-0805 (0805 (2012M) Capacitor)
pins: 1, 2
